# Altium footprint library heromap.PcbLib: 593 footprints (part 21 of 38)
Each footprint in its own frame and in the unit in brackets; x right, y up, seen from the top. Pads: shape width x height; smd on the part's side, far side on the other; paste and mask are expansions set on the pad; w line width, h text height; cw(c..) or ccw(c..) is an arc to the next point about the centre after c.
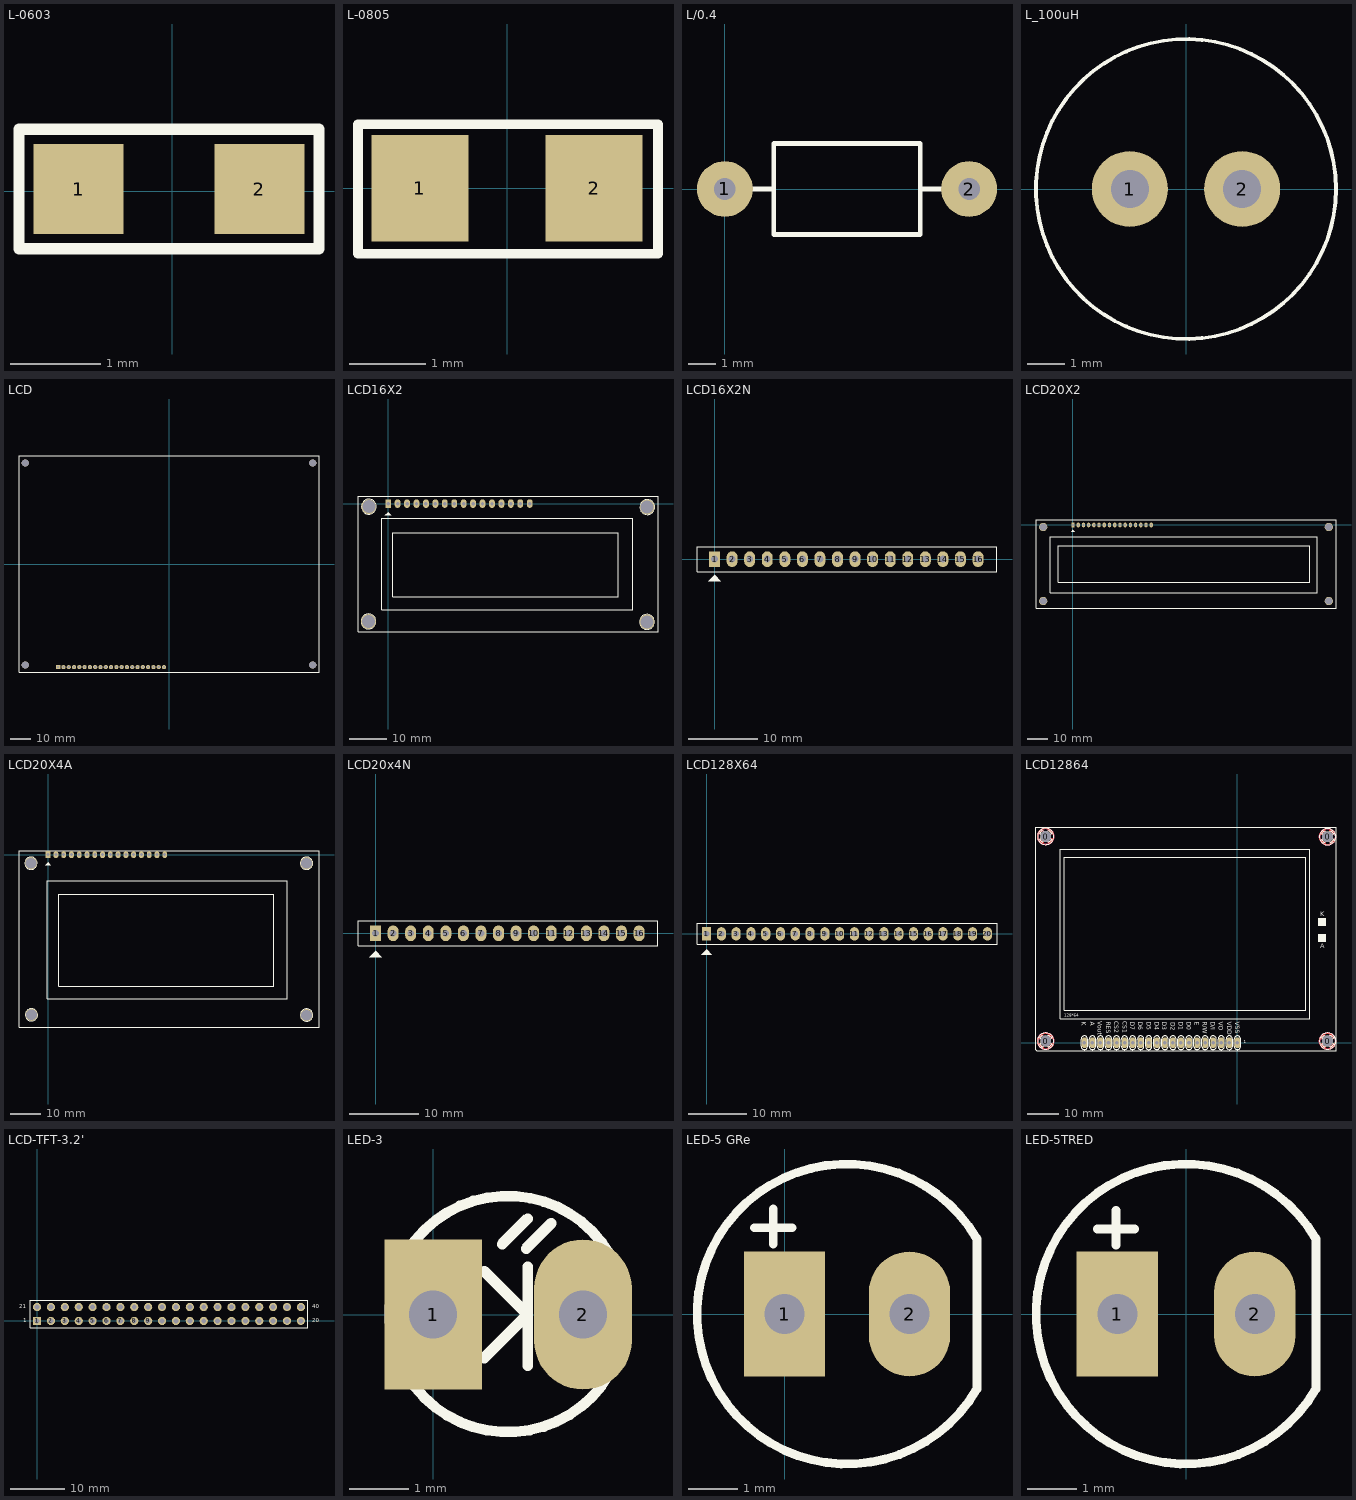
[diagram p20: the footprints below, top view; thin cyan lines are the x and y axes]

## L-0603 [mm] "Chip Capacitor; Body 1.6 x 0.8 mm (LxW typ)"
height 0.87
pads (2):
  rect 1x1 smd: 1(-1.041,0.025) 2(0.965,0.025)
Top Overlay:
  lines w0.127: -1.702,-0.635 -1.702,0.686 1.626,0.686 1.626,-0.635 -1.702,-0.635
3D body: height 0.51, standoff 0, extent 0.52,-0.375 0.78,0.429
3D body: height 0.51, standoff 0, extent -0.828,-0.376 -0.568,0.429
3D body: height 0.5, standoff 0, extent -0.825,-0.373 0.775,0.427

## L-0805 [mil] "Compoment SMD 80x50mil"
height 50
pads (2):
  rect 50x55 smd: 1(-45,0) 2(45,0)
Top Overlay:
  lines w5: -77,-34 78,-34 78,33 -77,33 -77,-34
3D body: height 43.31, standoff 0, extent 40,-20 50,20
3D body: height 43.31, standoff 0, extent -50,-20 -40,20
3D body: height 39.37, standoff 0, extent -40,-20 40,20

## L/0.4 [mil] "Inductor , 2 Pin, L 350mil, W 150 mil"
height 150
pads (2):
  round 80 hole 31: 1(0,0) 2(350,0)
Top Overlay:
  lines w7: 70,0 40,0 70,0 ; 70,0 70,-65 280,-65 280,0 ; 70,0 70,65 280,65 280,0 ; 280,0 310,0 280,0
3D body: height 93.01, standoff 65.56, extent 251.79,-14 350.22,13.51
3D body: height 79.34, standoff -19.09, extent 336.33,-13.75 363.78,13.75
3D body: height 92.52, standoff 64.96, extent 336.35,-13.69 363.76,13.75
3D body: height 92.52, standoff 64.96, extent -13.76,-13.75 13.66,13.69
3D body: height 79.34, standoff -19.09, extent -13.78,-13.75 13.67,13.76
3D body: height 93.01, standoff 65.56, extent -0.21,-13.51 98.21,14
3D body: height 137.93, standoff 20.29, extent 75.57,-59 272.43,58.88

## L_100uH [mil]
pads (2):
  round 80 hole 40: 1(-59.06,0) 2(59.06,0)
Top Overlay:
  circle w4: c0,0 r157.79
3D body: height 39.37, standoff -39.37, extent 43.33,-15.73 74.78,15.73
3D body: height 39.37, standoff -39.37, extent -74.78,-15.73 -43.33,15.73
3D body: height 358.27, standoff 314.96, extent -110.22,-110.22 110.22,110.22
3D body: height 354.33, standoff 0, extent -137.78,-137.78 137.78,137.78

## LCD [mil]
pads (21):
  rect 80x80 hole 40: 1(-2094.49,-1948.82)
  round 80 hole 40: 2(-1994.49,-1948.82) 3(-1894.49,-1948.82) 4(-1794.49,-1948.82) 5(-1694.49,-1948.82) 6(-1594.49,-1948.82) 7(-1494.49,-1948.82) 8(-1394.49,-1948.82) 9(-1294.49,-1948.82) 10(-1194.49,-1948.82) 11(-1094.49,-1948.82) 12(-994.49,-1948.82) 13(-894.49,-1948.82) 14(-794.49,-1948.82) 15(-694.49,-1948.82) 16(-594.49,-1948.82) 17(-494.49,-1948.82) 18(-394.49,-1948.82) 19(-294.49,-1948.82) 20(-194.49,-1948.82) 21(-94.49,-1948.82)
via 2716.54,1909.45 diameter 137.8 hole 137.8
via -2716.54,1909.45 diameter 137.8 hole 137.8
via -2716.54,-1909.45 diameter 137.8 hole 137.8
via 2716.54,-1909.45 diameter 137.8 hole 137.8
Top Overlay:
  lines w10: -2834.65,-2047.24 -2834.65,2047.24 2834.65,2047.24 2834.65,-2047.24 -2834.65,-2047.24
3D body: height 437.01, standoff 433.07, extent -134.11,-2047.22 -55.12,-1908.6
3D body: height 437.01, standoff 433.07, extent -434.11,-2047.22 -355.12,-1908.6
3D body: height 437.01, standoff 433.07, extent -534.11,-2047.22 -455.12,-1908.6
3D body: height 437.01, standoff 433.07, extent -334.11,-2047.22 -255.12,-1908.6
3D body: height 437.01, standoff 433.07, extent -234.11,-2047.22 -155.12,-1908.6
3D body: height 437.01, standoff 433.07, extent -834.11,-2047.22 -755.12,-1908.6
3D body: height 437.01, standoff 433.07, extent -934.11,-2047.22 -855.12,-1908.6
3D body: height 437.01, standoff 433.07, extent -734.11,-2047.22 -655.12,-1908.6
3D body: height 437.01, standoff 433.07, extent -634.11,-2047.22 -555.12,-1908.6
3D body: height 437.01, standoff 433.07, extent -1234.11,-2047.22 -1155.12,-1908.6
3D body: height 437.01, standoff 433.07, extent -1334.11,-2047.22 -1255.12,-1908.6
3D body: height 437.01, standoff 433.07, extent -1134.11,-2047.22 -1055.12,-1908.6
3D body: height 437.01, standoff 433.07, extent -1034.11,-2047.22 -955.12,-1908.6
3D body: height 437.01, standoff 433.07, extent -1634.11,-2047.22 -1555.12,-1908.6
3D body: height 437.01, standoff 433.07, extent -1734.11,-2047.22 -1655.12,-1908.6
3D body: height 437.01, standoff 433.07, extent -1534.11,-2047.22 -1455.12,-1908.6
3D body: height 437.01, standoff 433.07, extent -1434.11,-2047.22 -1355.12,-1908.6
3D body: height 437.01, standoff 433.07, extent -1834.11,-2047.22 -1755.12,-1908.6
3D body: height 437.01, standoff 433.07, extent -1934.11,-2047.22 -1855.12,-1908.6
3D body: height 437.01, standoff 433.07, extent -2134.11,-2047.22 -2055.12,-1908.6
3D body: height 437.01, standoff 433.07, extent -2034.11,-2047.22 -1955.12,-1908.6
3D body: height 472.44, standoff -39.37, extent -607.5,-1962.5 -581,-1936
3D body: height 472.44, standoff -39.37, extent -507.5,-1962.5 -481,-1936
3D body: height 472.44, standoff -39.37, extent -307.5,-1962.5 -281,-1936
3D body: height 472.44, standoff -39.37, extent -407.5,-1962.5 -381,-1936
3D body: height 472.44, standoff -39.37, extent -107.5,-1962.5 -81,-1936
3D body: height 472.44, standoff -39.37, extent -207.5,-1962.5 -181,-1936
3D body: height 472.44, standoff -39.37, extent -1307.5,-1962.5 -1281,-1936
3D body: height 472.44, standoff -39.37, extent -1207.5,-1962.5 -1181,-1936
3D body: height 472.44, standoff -39.37, extent -1007.5,-1962.5 -981,-1936
3D body: height 472.44, standoff -39.37, extent -1107.5,-1962.5 -1081,-1936
3D body: height 472.44, standoff -39.37, extent -707.5,-1962.5 -681,-1936
3D body: height 472.44, standoff -39.37, extent -607.5,-1962.5 -581,-1936
3D body: height 472.44, standoff -39.37, extent -807.5,-1962.5 -781,-1936
3D body: height 472.44, standoff -39.37, extent -907.5,-1962.5 -881,-1936
3D body: height 472.44, standoff -39.37, extent -1707.5,-1962.5 -1681,-1936
3D body: height 472.44, standoff -39.37, extent -1607.5,-1962.5 -1581,-1936
3D body: height 472.44, standoff -39.37, extent -1407.5,-1962.5 -1381,-1936
3D body: height 472.44, standoff -39.37, extent -1507.5,-1962.5 -1481,-1936
3D body: height 472.44, standoff -39.37, extent -1907.5,-1962.5 -1881,-1936
3D body: height 472.44, standoff -39.37, extent -1807.5,-1962.5 -1781,-1936
3D body: height 472.44, standoff -39.37, extent -2007.5,-1962.5 -1981,-1936
3D body: height 472.44, standoff -39.37, extent -2107.5,-1962.5 -2081,-1936
3D body: height 393.7, standoff 0, extent -2154.98,-2009.31 -34,-1890.02
3D body: height 433.07, standoff 393.7, extent -2834.63,-2047.22 2834.63,2047.22
3D body: height 791.34, standoff 433.07, extent -2578.74,-1568.9 2578.74,1568.9
3D body: height 748.03, standoff 433.07, extent -2244.09,-1259.84 2244.09,1259.84
3D body: height 472.44, standoff 433.07, extent 2578.74,-196.85 2834.65,196.85
3D body: height 59.06, standoff 0, extent -2814.94,-2007.85 -2618.13,-1811.04
3D body: height 511.81, standoff -78.74, extent -2775.57,-1968.48 -2657.5,-1850.41
3D body: height 472.44, standoff 433.07, extent -2814.94,-2007.85 -2618.13,-1811.04
3D body: height 59.06, standoff 0, extent 2618.13,-2007.85 2814.94,-1811.04
3D body: height 511.81, standoff -78.74, extent 2657.5,-1968.48 2775.57,-1850.41
3D body: height 472.44, standoff 433.07, extent 2618.13,-2007.85 2814.94,-1811.04
3D body: height 59.06, standoff 0, extent 2618.13,1811.04 2814.94,2007.85
3D body: height 511.81, standoff -78.74, extent 2657.5,1850.41 2775.57,1968.48
3D body: height 472.44, standoff 433.07, extent 2618.13,1811.04 2814.94,2007.85
3D body: height 472.44, standoff 433.07, extent -2814.94,1811.04 -2618.13,2007.85
3D body: height 511.81, standoff -78.74, extent -2775.57,1850.41 -2657.5,1968.48
3D body: height 59.06, standoff 0, extent -2814.94,1811.04 -2618.13,2007.85

## LCD16X2 [mil] "LCD dipslay 16x2, 16 pin"
height 400
pads (20):
  rect 62x90 hole 36: 1(0,0)
  oval 62x90 hole 36: 2(100,0) 3(200,0) 4(300,0) 5(400,0) 6(500,0) 7(600,0) 8(700,0) 9(800,0) 10(900,0) 11(1000,0) 12(1100,0) 13(1200,0) 14(1300,0) 15(1400,0) 16(1500,0)
  round 157.48 hole 137.8: "Hole 0"(-208,-1250) "Hole 0"(-206,-33) "Hole 0"(2743,-1254) "Hole 0"(2746,-36)
Top Overlay:
  circle w7: c2742.94,-1254 r79.06
  circle w7: c2746.94,-37 r79.06
  circle w7: c-205.06,-32 r79.06
  circle w7: c-209.06,-1249 r79.06
  region: 0,-90 -35,-125 35,-125
  lines w7: -320,-1360 -320,80 2860,80 2860,-1360 -320,-1360 ; -69,-1123 -69,-153 2590,-153 2590,-1123 -69,-1123 ; 50,-987 50,-309 2438,-309 2438,-987 50,-987
3D body "LCD module 16 X 2 backlight.STEP": height 669.91, standoff 149.91, extent -318,-1357 2851.29,80
3D body: height 255.91, standoff 196.85, extent -50,-50 50,50
3D body: height 354.33, standoff -39.37, extent -15.62,-15.71 15.75,15.72
3D body: height 255.91, standoff 196.85, extent 50,-50 150,50
3D body: height 354.33, standoff -39.37, extent 84.38,-15.71 115.75,15.72
3D body: height 255.91, standoff 196.85, extent 150,-50 250,50
3D body: height 354.33, standoff -39.37, extent 184.38,-15.71 215.75,15.72
3D body: height 255.91, standoff 196.85, extent 250,-50 350,50
3D body: height 354.33, standoff -39.37, extent 284.38,-15.71 315.75,15.72
3D body: height 255.91, standoff 196.85, extent 350,-50 450,50
3D body: height 354.33, standoff -39.37, extent 384.38,-15.71 415.75,15.72
3D body: height 354.33, standoff -39.37, extent 884.38,-15.71 915.75,15.72
3D body: height 255.91, standoff 196.85, extent 850,-50 950,50
3D body: height 354.33, standoff -39.37, extent 784.38,-15.71 815.75,15.72
3D body: height 255.91, standoff 196.85, extent 750,-50 850,50
3D body: height 354.33, standoff -39.37, extent 684.38,-15.71 715.75,15.72
3D body: height 255.91, standoff 196.85, extent 650,-50 750,50
3D body: height 354.33, standoff -39.37, extent 584.38,-15.71 615.75,15.72
3D body: height 255.91, standoff 196.85, extent 550,-50 650,50
3D body: height 354.33, standoff -39.37, extent 484.38,-15.71 515.75,15.72
3D body: height 255.91, standoff 196.85, extent 450,-50 550,50
3D body: height 354.33, standoff -39.37, extent 1384.38,-15.71 1415.75,15.72
3D body: height 255.91, standoff 196.85, extent 1350,-50 1450,50
3D body: height 354.33, standoff -39.37, extent 1284.38,-15.71 1315.75,15.72
3D body: height 255.91, standoff 196.85, extent 1250,-50 1350,50
3D body: height 354.33, standoff -39.37, extent 1184.38,-15.71 1215.75,15.72
3D body: height 255.91, standoff 196.85, extent 1150,-50 1250,50
3D body: height 354.33, standoff -39.37, extent 1084.38,-15.71 1115.75,15.72
3D body: height 255.91, standoff 196.85, extent 1050,-50 1150,50
3D body: height 354.33, standoff -39.37, extent 984.38,-15.71 1015.75,15.72
3D body: height 255.91, standoff 196.85, extent 950,-50 1050,50
3D body: height 354.33, standoff -39.37, extent 1484.38,-15.71 1515.75,15.72
3D body: height 255.91, standoff 196.85, extent 1450,-50 1550,50

## LCD16X2N [mil] "LCD dipslay 16x2, 16 pin"
height 400
pads (16):
  rect 62x90 hole 39: 1(0,0)
  oval 62x90 hole 39: 2(100,0) 3(200,0) 4(300,0) 5(400,0) 6(500,0) 7(600,0) 8(700,0) 9(800,0) 10(900,0) 11(1000,0) 12(1100,0) 13(1200,0) 14(1300,0) 15(1400,0) 16(1500,0)
Top Overlay:
  region: 0,-90 -35,-125 35,-125
  lines w7: -100,-71 1608,-71 1608,70 -100,70 -100,-71

## LCD20X2 [mil] "LCD dipslay 20x2, 16 pin"
height 400
pads (20):
  rect 62x90 hole 36: 1(0,0)
  oval 62x90 hole 36: 2(100,0) 3(200,0) 4(300,0) 5(400,0) 6(500,0) 7(600,0) 8(700,0) 9(800,0) 10(900,0) 11(1000,0) 12(1100,0) 13(1200,0) 14(1300,0) 15(1400,0) 16(1500,0)
  round 157.48 hole 137.8: "Hole 0"(-570.87,-1456.69) "Hole 0"(-570.87,-39.37) "Hole 0"(4901.57,-1456.69) "Hole 0"(4901.57,-39.37)
Top Overlay:
  region: 0,-90 -35,-125 35,-125
  lines w7: -708.66,-1594.49 5039.37,-1594.49 5039.37,100 -708.66,100 -708.66,-1594.49 ; -436,-1300 4682,-1300 4682,-225 -436,-225 -436,-1300 ; -286,-1100 4532,-1100 4532,-400 -286,-400 -286,-1100
3D body "SW3dPS-densitron_lm4306.STEP": height 421, standoff -183, extent -670,-1487.5 7525,87.5

## LCD20X4A [mil] "LCD dipslay 20x4, 16 pin"
height 400
pads (20):
  rect 62x90 hole 39: 1(0,0)
  oval 62x90 hole 39: 2(100,0) 3(200,0) 4(300,0) 5(400,0) 6(500,0) 7(600,0) 8(700,0) 9(800,0) 10(900,0) 11(1000,0) 12(1100,0) 13(1200,0) 14(1300,0) 15(1400,0) 16(1500,0)
  round 157.48 hole 137.8: "Hole 0"(-220,-110) "Hole 0"(-215,-2060) "Hole 0"(3325,-2065) "Hole 0"(3325,-110)
Top Overlay:
  circle w7: c3324.94,-2063 r79.06
  circle w7: c3324.94,-110 r79.06
  circle w7: c-221.06,-110 r79.06
  circle w7: c-215.06,-2061 r79.06
  region: 0,-100 -35,-135 35,-135
  lines w7: -375,-2220 -375,50 3485,50 3485,-2220 -374,-2220 ; -11,-1852 -11,-337 3076,-337 3076,-1852 -11,-1852 ; 139,-1695 139,-512 2905,-512 2905,-1695 139,-1695

## LCD20x4N [mil] "LCD dipslay 20x4, 16 pin"
height 400
pads (16):
  rect 62x90 hole 39: 1(0,0)
  oval 62x90 hole 39: 2(100,0) 3(200,0) 4(300,0) 5(400,0) 6(500,0) 7(600,0) 8(700,0) 9(800,0) 10(900,0) 11(1000,0) 12(1100,0) 13(1200,0) 14(1300,0) 15(1400,0) 16(1500,0)
Top Overlay:
  region: 0,-100 -35,-135 35,-135
  lines w7: -100,-71 1608,-71 1608,70 -100,70 -100,-71

## LCD128X64 [mil] "LCD Graphic 128x64, 20 pin"
height 400
pads (20):
  rect 62x90 hole 39: 1(0,0)
  oval 62x90 hole 39: 2(100,0) 3(200,0) 4(300,0) 5(400,0) 6(500,0) 7(600,0) 8(700,0) 9(800,0) 10(900,0) 11(1000,0) 12(1100,0) 13(1200,0) 14(1300,0) 15(1400,0) 16(1500,0) 17(1600,0) 18(1700,0) 19(1800,0) 20(1900,0)
Top Overlay:
  region: 0,-105 -35,-140 35,-140
  lines w7: -65,-71 -65,70 1965,70 1965,-71 -65,-71

## LCD12864 [mil] "GLCD"
pads (24):
  round 135 hole 133: 0(-2380,20) 0(-2380,2560) 0(1120,20) 0(1120,2557)
  oval 70x135 hole 44: 1(0,0) 2(-100,0) 3(-200,0) 4(-300,0) 5(-400,0) 6(-500,0) 7(-600,0) 8(-700,0) 9(-800,0) 10(-900,0) 11(-1000,0) 12(-1100,0) 13(-1200,0) 14(-1300,0) 15(-1400,0) 16(-1500,0) 17(-1600,0) 18(-1700,0) 19(-1800,0) 20(-1900,0)
Top Layer:
  circle w20: c-2380,20 r100
  circle w20: c-2380,2561 r100
  circle w20: c1120,2557 r100
  circle w20: c1120,20 r100
  lines w25: -2458.13,53.48 cw(c-2380,20) -2418.01,96.03 ; -2458.13,2594.48 cw(c-2380,2561) -2418.01,2637.03 ; -2456.03,-18.01 ccw(c-2380,20) -2413.48,-58.13 ; -2456.03,2522.99 ccw(c-2380,2561) -2413.48,2482.87 ; -2346.52,98.13 cw(c-2380,20) -2303.97,58.01 ; -2346.52,2639.13 cw(c-2380,2561) -2303.97,2599.01 ; -2341.99,-56.03 ccw(c-2380,20) -2301.87,-13.48 ; -2341.99,2484.97 ccw(c-2380,2561) -2301.87,2527.52 ; 1041.87,53.48 cw(c1120,20) 1081.99,96.03 ; 1041.87,2590.48 cw(c1120,2557) 1081.99,2633.03 ; 1043.97,-18.01 ccw(c1120,20) 1086.52,-58.13 ; 1043.97,2518.99 ccw(c1120,2557) 1086.52,2478.87 ; 1153.48,98.13 cw(c1120,20) 1196.03,58.01 ; 1153.48,2635.13 cw(c1120,2557) 1196.03,2595.01 ; 1158.01,-56.03 ccw(c1120,20) 1198.13,-13.48 ; 1158.01,2480.97 ccw(c1120,2557) 1198.13,2523.52
Bottom Layer:
  circle w20: c-2380,20 r100
  circle w20: c-2380,2561 r100
  circle w20: c1120,2557 r100
  circle w20: c1120,20 r100
  lines w25: -2458.13,53.48 cw(c-2380,20) -2418.01,96.03 ; -2458.13,2594.48 cw(c-2380,2561) -2418.01,2637.03 ; -2456.03,-18.01 ccw(c-2380,20) -2413.48,-58.13 ; -2456.03,2522.99 ccw(c-2380,2561) -2413.48,2482.87 ; -2346.52,98.13 cw(c-2380,20) -2303.97,58.01 ; -2346.52,2639.13 cw(c-2380,2561) -2303.97,2599.01 ; -2341.99,-56.03 ccw(c-2380,20) -2301.87,-13.48 ; -2341.99,2484.97 ccw(c-2380,2561) -2301.87,2527.52 ; 1041.87,53.48 cw(c1120,20) 1081.99,96.03 ; 1041.87,2590.48 cw(c1120,2557) 1081.99,2633.03 ; 1043.97,-18.01 ccw(c1120,20) 1086.52,-58.13 ; 1043.97,2518.99 ccw(c1120,2557) 1086.52,2478.87 ; 1153.48,98.13 cw(c1120,20) 1196.03,58.01 ; 1153.48,2635.13 cw(c1120,2557) 1196.03,2595.01 ; 1158.01,-56.03 ccw(c1120,20) 1198.13,-13.48 ; 1158.01,2480.97 ccw(c1120,2557) 1198.13,2523.52
Top Overlay:
  drawing of 158 lines, arcs and shapes, not listed
  text "1" at 77.5,-10 h36
  text "128*64" at -2150,325 h36
  text "K" at 1027.5,1572.5 h60
  text "A" at 1027.5,1172.5 h60
  text "VSS" at -27.5,260 h55
  text "VDD" at -125,262.5 h55
  text "VO" at -232.5,262.5 h55
  text "E" at -527.5,257.5 h55
  text "D0" at -627.5,257.5 h55
  text "D1" at -727.5,257.5 h55
  text "D2" at -827.5,255 h55
  text "D3" at -930,257.5 h55
  text "D4" at -1027.5,257.5 h55
  text "D5" at -1127.5,257.5 h55
  text "D6" at -1230,260 h55
  text "D7" at -1327.5,260 h55
  text "CS1" at -1425,265 h55
  text "CS2" at -1527.5,265 h55
  text "RES" at -1630,262.5 h55
  text "Vout" at -1732.5,267.5 h55
  text "A" at -1825,257.5 h55
  text "K" at -1930,257.5 h55
  text "R/W" at -430,257.5 h55
  text "D/I" at -327.5,262.5 h55
Bottom Overlay:
  lines w10: -1940,-45 ccw(c-1900,-45) -1860,-45 -1860,45 ccw(c-1900,45) -1940,45 -1940,-45 ; -1840,-45 ccw(c-1800,-45) -1760,-45 -1760,45 ccw(c-1800,45) -1840,45 -1840,-45 ; -1740,-45 ccw(c-1700,-45) -1660,-45 -1660,45 ccw(c-1700,45) -1740,45 -1740,-45 ; -1640,-45 ccw(c-1600,-45) -1560,-45 -1560,45 ccw(c-1600,45) -1640,45 -1640,-45 ; -1540,-45 ccw(c-1500,-45) -1460,-45 -1460,45 ccw(c-1500,45) -1540,45 -1540,-45 ; -1440,-45 ccw(c-1400,-45) -1360,-45 -1360,45 ccw(c-1400,45) -1440,45 -1440,-45 ; -1340,-45 ccw(c-1300,-45) -1260,-45 -1260,45 ccw(c-1300,45) -1340,45 -1340,-45 ; -1240,-45 ccw(c-1200,-45) -1160,-45 -1160,45 ccw(c-1200,45) -1240,45 -1240,-45 ; -1140,-45 ccw(c-1100,-45) -1060,-45 -1060,45 ccw(c-1100,45) -1140,45 -1140,-45 ; -1040,-45 ccw(c-1000,-45) -960,-45 -960,45 ccw(c-1000,45) -1040,45 -1040,-45 ; -940,-45 ccw(c-900,-45) -860,-45 -860,45 ccw(c-900,45) -940,45 -940,-45 ; -840,-45 ccw(c-800,-45) -760,-45 -760,45 ccw(c-800,45) -840,45 -840,-45 ; -740,-45 ccw(c-700,-45) -660,-45 -660,45 ccw(c-700,45) -740,45 -740,-45 ; -640,-45 ccw(c-600,-45) -560,-45 -560,45 ccw(c-600,45) -640,45 -640,-45 ; -540,-45 ccw(c-500,-45) -460,-45 -460,45 ccw(c-500,45) -540,45 -540,-45 ; -440,-45 ccw(c-400,-45) -360,-45 -360,45 ccw(c-400,45) -440,45 -440,-45 ; -340,-45 ccw(c-300,-45) -260,-45 -260,45 ccw(c-300,45) -340,45 -340,-45 ; -240,-45 ccw(c-200,-45) -160,-45 -160,45 ccw(c-200,45) -240,45 -240,-45 ; -140,-45 ccw(c-100,-45) -60,-45 -60,45 ccw(c-100,45) -140,45 -140,-45 ; -40,-45 ccw(c0,-45) 40,-45 40,45 ccw(c0,45) -40,45 -40,-45
Bottom Solder:
  circle w25: c-2380,20 r85.44
  circle w25: c-2380,2561 r85.44
  circle w25: c1120,2557 r85.44
  circle w25: c1120,20 r85.44

## LCD-TFT-3.2' [mm] "Connector; Header; 20x2 Position"
pads (40):
  rect 1.5x1.5 hole 0.9: 1(0,0)
  round 1.5 hole 0.9: 2(2.54,0) 3(5.08,0) 4(7.62,0) 5(10.16,0) 6(12.7,0) 7(15.24,0) 8(17.78,0) 9(20.32,0) 10(22.86,0) 11(25.4,0) 12(27.94,0) 13(30.48,0) 14(33.02,0) 15(35.56,0) 16(38.1,0) 17(40.64,0) 18(43.173,0.01) 19(45.713,0.01) 20(48.253,0.01) 21(0,2.54) 22(2.54,2.54) 23(5.08,2.54) 24(7.62,2.54) 25(10.16,2.54) 26(12.7,2.54) 27(15.24,2.54) 28(17.78,2.54) 29(20.32,2.54) 30(22.853,2.55) 31(25.4,2.54) 32(27.94,2.54) 33(30.48,2.55) 34(33.02,2.55) 35(35.56,2.54) 36(38.1,2.55) 37(40.64,2.54) 38(43.173,2.55) 39(45.713,2.55) 40(48.26,2.54)
Top Overlay:
  lines w0.2: -1.27,-1.27 49.53,-1.27 49.53,3.81 -1.27,3.81 -1.27,-1.27
  text "1" at -2.54,-0.508 h1.27
  text "21" at -3.302,2.032 h1.27
  text "40" at 50.292,2.032 h1.27
  text "20" at 50.292,-0.508 h1.27
3D body "User Library-TFT 3_2 with touch screen.STEP": height 13.35, standoff -1.09, extent -7.87,-2.032 56.13,91.968

## LED-3 [mil] "LED 2 PIN, 3ly Only colour"
height 300
pads (2):
  rect 65x100 hole 32: 1(0,0)
  oval 65x100 hole 32: 2(100,0)
Top Overlay:
  lines w7: 34,-29 63,0 34,29 ; 46,47 63,64 ; 62,44 79,61 ; 63,-34 63,32 ; 117.92,-39.35 117.92,39.84
  lines w7.01: 117.57,-39.74 cw(c49.8,0.35) 117.72,40.19
3D body "SW3DPS-LED DIP 3MM-DEFAULT.STEP": height 255.91, standoff -78.74, extent -28.9,-74.61 108.9,75

## LED-5 GRe [mil] "LED 2 PIN, 5 ly , Only colour,pin to pin 100mil"
height 300
pads (2):
  rect 65x100 hole 32: 1(0,0)
  oval 65x100 hole 32: 2(100,0)
Top Overlay:
  lines w7: -24,69 6,69 ; -9,56 -9,84 ; 153.51,60.71 ccw(c50,0) 153.94,-59.97 ; 154,-59 154,60
3D body "SW3dPS-LED green.STEP": height 386.85, standoff -67.48, extent -54.33,-103.66 154.33,105

## LED-5TRED [mil] "LED 2 PIN, 5 ly , Only colour, pin to pin 110mil"
height 300
pads (2):
  rect 65x100 hole 32: 1(-55,0)
  oval 65x100 hole 32: 2(55,0)
Top Overlay:
  lines w7: -71,68 -41,68 ; -56,55 -56,83 ; 103.51,60.71 ccw(c0,0) 103.94,-59.97 ; 104,-59 104,60
3D body "SW3dPS-LEDd5R.STEP": height 484.75, standoff -97.93, extent -115.69,-117 97.69,119.99